# Altium footprint library AUAV_X05.PcbLib: 69 footprints (part 5 of 5)
Each footprint in its own frame and in the unit in brackets; x right, y up, seen from the top. Pads: shape width x height; smd on the part's side, far side on the other; paste and mask are expansions set on the pad; w line width, h text height; cw(c..) or ccw(c..) is an arc to the next point about the centre after c.
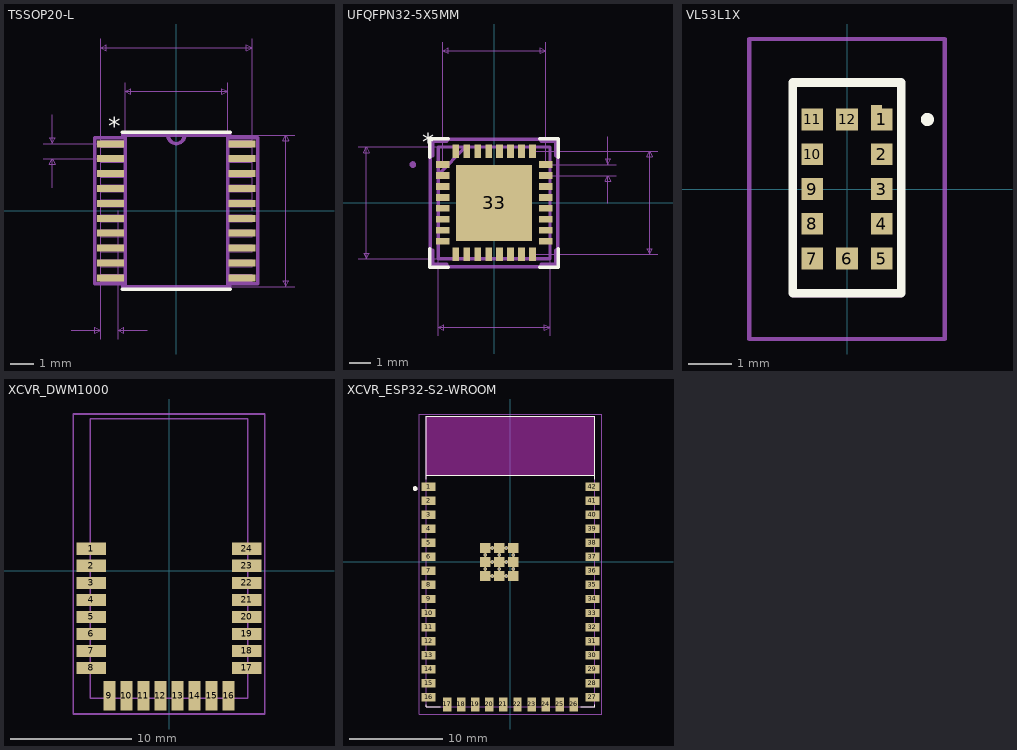
[diagram p4: the footprints below, top view; thin cyan lines are the x and y axes]

## TSSOP20-L [mil]
pads (20):
  rect 46x12 smd: 1(-113,115.16) 2(-113,89.57) 3(-113,63.98) 4(-113,38.39) 5(-113,12.8) 6(-113,-12.8) 7(-113,-38.39) 8(-113,-63.98) 9(-113,-89.57) 10(-113,-115.16) 11(113,-115.16) 12(113,-89.57) 13(113,-63.98) 14(113,-38.39) 15(113,-12.8) 16(113,12.8) 17(113,38.39) 18(113,63.98) 19(113,89.57) 20(113,115.16)
Top Overlay:
  lines w6: -93,-135 93,-135 ; -93,135 93,135
  text "*" at -117,129.61 h31.25
Mechanical 1:
  lines w1: -12,130 ccw(c0,130) 12,130 ; -130,-121.16 -88,-121.16 -88,-109.16 -130,-109.16 -130,-121.16 ; -130,-95.57 -88,-95.57 -88,-83.57 -130,-83.57 -130,-95.57 ; -130,-69.98 -88,-69.98 -88,-57.98 -130,-57.98 -130,-69.98 ; -130,-44.39 -88,-44.39 -88,-32.39 -130,-32.39 -130,-44.39 ; -130,-18.8 -88,-18.8 -88,-6.8 -130,-6.8 -130,-18.8 ; -130,6.8 -88,6.8 -88,18.8 -130,18.8 -130,6.8 ; -130,32.39 -88,32.39 -88,44.39 -130,44.39 -130,32.39 ; -130,57.98 -88,57.98 -88,69.98 -130,69.98 -130,57.98 ; -130,83.57 -88,83.57 -88,95.57 -130,95.57 -130,83.57 ; -130,109.16 -88,109.16 -88,121.16 -130,121.16 -130,109.16 ; -88,-130 -88,130 88,130 88,-130 -88,-130 ; 88,-121.16 130,-121.16 130,-109.16 88,-109.16 88,-121.16 ; 88,-95.57 130,-95.57 130,-83.57 88,-83.57 88,-95.57 ; 88,-69.98 130,-69.98 130,-57.98 88,-57.98 88,-69.98 ; 88,-44.39 130,-44.39 130,-32.39 88,-32.39 88,-44.39 ; 88,-18.8 130,-18.8 130,-6.8 88,-6.8 88,-18.8 ; 88,6.8 130,6.8 130,18.8 88,18.8 88,6.8 ; 88,32.39 130,32.39 130,44.39 88,44.39 88,32.39 ; 88,57.98 130,57.98 130,69.98 88,69.98 88,57.98 ; 88,83.57 130,83.57 130,95.57 88,95.57 88,83.57 ; 88,109.16 130,109.16 130,121.16 88,121.16 88,109.16
  text "*" at -117,129.61 h31.25
Mechanical 16:
  lines w1: -228,89.57 -113,89.57 ; -228,115.16 -113,115.16 ; -213,39.57 -213,89.57 ; -213,165.16 -213,115.16 ; -180,-205 -130,-205 ; -130,-220 -130,0 -130,295 ; -100,-220 -100,0 ; -88,0 -88,220 ; -50,-205 -100,-205 ; 0,-130 203,-130 ; 0,130 203,130 ; 88,0 88,220 ; 130,0 130,295 ; -213,89.57 -208,79.57 -218,79.57 -213,89.57 ; -213,115.16 -208,125.16 -218,125.16 -213,115.16 ; -130,-205 -140,-210 -140,-200 -130,-205 ; -130,280 -120,275 -120,285 -130,280 ; -130,280 130,280 ; -100,-205 -90,-210 -90,-200 -100,-205 ; -88,205 -78,200 -78,210 -88,205 ; -88,205 88,205 ; 88,205 78,200 78,210 88,205 ; 130,280 120,275 120,285 130,280 ; 188,-130 193,-120 183,-120 188,-130 ; 188,-130 188,130 ; 188,130 193,120 183,120 188,130
  lines w6: -14.67,130 ccw(c0,130) 14.67,130 ; -140,-125.16 -92,-125.16 -92,-134 92,-134 92,-125.16 140,-125.16 140,125.16 92,125.16 92,134 -92,134 -92,125.16 -140,125.16 -140,-125.16 ; -88,-130 88,-130 88,130 -88,130 -88,-130
  text "0.03in/0.762mm" at -115,-225 h15.62
  text "0.026in/0.65mm" at -233,102.36 h15.62
  text "0.26in/6.604mm" at 208,0 h15.62
  text "0.26in/6.604mm" at 0,300 h15.62
  text "0.176in/4.47mm" at 0,225 h15.62
  text "Alt 2 Padstyle: OX90Y60D30P" at 0,-580 h31.25
  text "Alt 1 Padstyle: OX60Y90D30P" at 0,-520 h31.25
  text "Pin One Padstyle: RX46Y12D0T" at 0,-340 h31.25
  text "Default Padstyle: RX46Y12D0T" at 0,-280 h31.25
3D body "TSSOP20.step": height 47.09, standoff 0, extent -130,-130 130,130

## UFQFPN32-5X5MM [mil]
pads (33):
  rect 24x12 smd: 1(-92.52,68.92) 2(-92.52,49.23) 3(-92.52,29.54) 4(-92.52,9.85) 5(-92.52,-9.85) 6(-92.52,-29.54) 7(-92.52,-49.23) 8(-92.52,-68.92) 17(92.52,-68.92) 18(92.52,-49.23) 19(92.52,-29.54) 20(92.52,-9.85) 21(92.52,9.85) 22(92.52,29.54) 23(92.52,49.23) 24(92.52,68.92)
  rect 12x24 smd: 9(-68.92,-92.52) 10(-49.23,-92.52) 11(-29.54,-92.52) 12(-9.85,-92.52) 13(9.85,-92.52) 14(29.54,-92.52) 15(49.23,-92.52) 16(68.92,-92.52) 25(68.92,92.52) 26(49.23,92.52) 27(29.54,92.52) 28(9.85,92.52) 29(-9.85,92.52) 30(-29.54,92.52) 31(-49.23,92.52) 32(-68.92,92.52)
  rect 136x136 smd: 33(0,0)
Top Overlay:
  lines w6: -115.5,-82.06 -115.5,-115.5 -82.06,-115.5 ; -115.5,82.06 -115.5,115.5 -82.06,115.5 ; 82.06,-115.5 115.5,-115.5 115.5,-82.06 ; 82.06,115.5 115.5,115.5 115.5,82.06
  text "*" at -129.52,93.76 h31.25
Mechanical 1:
  lines w1: -100.5,50.5 -50.5,100.5 ; -100.5,-100.5 -100.5,100.5 100.5,100.5 100.5,-100.5 -100.5,-100.5
  text "*" at -70.52,78.76 h31.25
Mechanical 16:
  circle w6: c-146.02,68.92 r3
  lines w1: -244.52,-100.5 100.5,-100.5 ; -244.52,100.5 100.5,100.5 100.5,-238.61 ; -100.5,-238.61 -100.5,100.5 ; -92.52,68.92 -92.52,288.61 ; 68.92,-92.52 294.52,-92.52 ; 68.92,92.52 294.52,92.52 ; 92.52,49.23 219.52,49.23 ; 92.52,288.61 92.52,68.92 219.52,68.92 ; 204.52,-0.78 204.52,49.23 ; 204.52,118.92 204.52,68.92 ; -229.52,-100.5 -224.52,-90.5 -234.52,-90.5 -229.52,-100.5 ; -229.52,-100.5 -229.52,100.5 ; -229.52,100.5 -224.52,90.5 -234.52,90.5 -229.52,100.5 ; -100.5,-223.61 -90.5,-228.61 -90.5,-218.61 -100.5,-223.61 ; -100.5,-223.61 100.5,-223.61 ; -92.52,273.61 -82.52,268.61 -82.52,278.61 -92.52,273.61 ; -92.52,273.61 92.52,273.61 ; 92.52,273.61 82.52,268.61 82.52,278.61 92.52,273.61 ; 100.5,-223.61 90.5,-228.61 90.5,-218.61 100.5,-223.61 ; 204.52,49.23 209.52,39.23 199.52,39.23 204.52,49.23 ; 204.52,68.92 209.52,78.92 199.52,78.92 204.52,68.92 ; 279.52,-92.52 284.52,-82.52 274.52,-82.52 279.52,-92.52 ; 279.52,-92.52 279.52,92.52 ; 279.52,92.52 284.52,82.52 274.52,82.52 279.52,92.52
  lines w6: -100.5,50.5 -50.5,100.5 ; -114.52,-84.92 -114.52,84.92 -110.5,84.92 -110.5,110.5 -84.92,110.5 -84.92,114.52 84.92,114.52 84.92,110.5 110.5,110.5 110.5,84.92 114.52,84.92 114.52,-84.92 110.5,-84.92 110.5,-110.5 84.92,-110.5 84.92,-114.52 -84.92,-114.52 -84.92,-110.5 -110.5,-110.5 -110.5,-84.92 -114.52,-84.92 ; -100.5,-100.5 100.5,-100.5 100.5,100.5 -100.5,100.5 -100.5,-100.5
  text "0.201in/5.105mm" at 0,-243.61 h15.62
  text "0.201in/5.105mm" at -249.52,0 h15.62
  text "0.185in/4.7mm" at 299.52,0 h15.62
  text "0.185in/4.7mm" at 0,293.61 h15.62
  text "0.02in/0.5mm" at 224.52,59.07 h15.62
  text "Alt 2 Padstyle: OX90Y60D30P" at 0,-538.61 h31.25
  text "Alt 1 Padstyle: OX60Y90D30P" at 0,-478.61 h31.25
  text "Heat Tab Padstyle: RX136Y136D0T" at 0,-358.61 h31.25
  text "Default Padstyle: RX12Y24D0T" at 0,-298.61 h31.25
3D body "UFQFPN32-5x5mm.step": height 22.09, standoff 0, extent -102.52,-102.52 102.52,102.52

## VL53L1X [mm]
pads (13):
  rect 0.5x0.5 smd: 1(0.8,1.6) 2(0.8,0.8) 3(0.8,0) 4(0.8,-0.8) 5(0.8,-1.6) 6(0,-1.6) 7(-0.8,-1.6) 8(-0.8,-0.8) 9(-0.8,0) 10(-0.8,0.8) 11(-0.8,1.6) 12(0,1.6)
  rect 0.25x0.08 smd: 13(0.675,1.89)
Top Overlay:
  lines w0.2: 1.8,1.6 ccw(c1.85,1.6) 1.9,1.6 ; 1.8,1.6 cw(c1.85,1.6) 1.9,1.6 ; 1.8,1.6 ccw(c1.85,1.6) 1.9,1.6 ; -1.25,-2.4 -1.25,2.45 1.25,2.45 1.25,-2.4 -1.25,-2.4
Top 3D Body:
  lines w0.1: -1.25,-2.45 -1.25,2.45 1.25,2.45 1.25,-2.45 -1.25,-2.45
Mechanical 15:
  lines w0.1: -2.25,-3.45 -2.25,3.45 2.25,3.45 2.25,-3.45 -2.25,-3.45
3D body "vl53l1x.step": height 1.55, standoff -0.01, extent -1.25,-2.45 1.25,2.45

## XCVR_DWM1000 [mm]
pads (24):
  rect 2.45x1 smd: 1(-6.4,1.8) 2(-6.4,0.4) 3(-6.4,-1) 4(-6.4,-2.4) 5(-6.4,-3.8) 6(-6.4,-5.2) 7(-6.4,-6.6) 8(-6.4,-8) 17(6.4,-8) 18(6.4,-6.6) 19(6.4,-5.2) 20(6.4,-3.8) 21(6.4,-2.4) 22(6.4,-1) 23(6.4,0.4) 24(6.4,1.8)
  rect 1x2.45 smd: 9(-4.9,-10.295) 10(-3.5,-10.295) 11(-2.1,-10.295) 12(-0.7,-10.295) 13(0.7,-10.295) 14(2.1,-10.295) 15(3.5,-10.295) 16(4.9,-10.295)
Top 3D Body:
  lines w0.127: -6.5,-10.5 -6.5,12.5 6.5,12.5 6.5,-10.5 -6.5,-10.5
Mechanical 15:
  lines w0.127: -7.9,-11.8 -7.9,12.9 7.9,12.9 7.9,-11.8 -7.9,-11.8
3D body "DWM1000--3DModel-STEP-56544.STEP": height 3.15, standoff 0, extent -6.6,-10.484 6.6,12.516

## XCVR_ESP32-S2-WROOM [mm]
pads (63):
  rect 1.5x0.9 smd: 1(-8.75,8) 2(-8.75,6.5) 3(-8.75,5) 4(-8.75,3.5) 5(-8.75,2) 6(-8.75,0.5) 7(-8.75,-1) 8(-8.75,-2.5) 9(-8.75,-4) 10(-8.75,-5.5) 11(-8.75,-7) 12(-8.75,-8.5) 13(-8.75,-10) 14(-8.75,-11.5) 15(-8.75,-13) 16(-8.75,-14.5) 27(8.75,-14.5) 28(8.75,-13) 29(8.75,-11.5) 30(8.75,-10) 31(8.75,-8.5) 32(8.75,-7) 33(8.75,-5.5) 34(8.75,-4) 35(8.75,-2.5) 36(8.75,-1) 37(8.75,0.5) 38(8.75,2) 39(8.75,3.5) 40(8.75,5) 41(8.75,6.5) 42(8.75,8)
  rect 0.9x1.5 smd: 17(-6.75,-15.25) 18(-5.25,-15.25) 19(-3.75,-15.25) 20(-2.25,-15.25) 21(-0.75,-15.25) 22(0.75,-15.25) 23(2.25,-15.25) 24(3.75,-15.25) 25(5.25,-15.25) 26(6.75,-15.25)
  rect 1.1x1.1 smd: 43.1(-1.19,-0.05) 43.2(-2.69,-0.05) 43.3(0.31,-0.05) 43.4(-2.69,-1.55) 43.5(-1.19,-1.55) 43.6(0.31,-1.55) 43.7(-2.69,1.45) 43.8(-1.19,1.45) 43.9(0.31,1.45)
  round 0.4 hole 0.2: 43.10(-1.19,0.7) 43.11(-2.69,0.7) 43.12(0.31,0.7) 43.13(-2.69,-0.8) 43.14(-1.19,-0.8) 43.15(0.31,-0.8) 43.16(-1.94,1.45) 43.17(-0.44,1.45) 43.18(-1.94,-0.05) 43.19(-0.44,-0.05) 43.20(-1.94,-1.55) 43.21(-0.44,-1.55)
Top Overlay:
  circle w0.3: c-10.177,7.788 r0.1
  lines w0.127: -9,-15.27 -9,-15.5 -7.52,-15.5 ; -9,8.77 -9,15.5 9,15.5 9,9.2 ; -8.96,9.2 9,9.2 ; 7.52,-15.5 9,-15.5 9,-15.27 ; 9,8.77 9,9.2
Keep-Out Layer:
  region: 9,9.2 -9,9.2 -9,15.5 9,15.5
  region: 9,9.2 -9,9.2 -9,15.5 9,15.5
  region: 9,9.2 -9,9.2 -9,15.5 9,15.5
Top 3D Body:
  circle w0.3: c-10.177,7.788 r0.1
  lines w0.127: -8.96,9.2 9,9.2 ; 9,9.2 9,15.5 -9,15.5 -9,-15.5 9,-15.5 9,9.2
  text "ANTENNA" at -4.455,12.171 h1.27
Mechanical 15:
  lines w0.05: -9.75,-16.28 -9.75,15.75 9.75,15.75 9.75,-16.28 -9.75,-16.28
3D body "step_temp.STEP": height 3.45, standoff 0, extent -9,-15.5 9,15.5